# Altium footprint library Connectors THD.PcbLib: 631 footprints (part 5 of 46) (continued)
## 3M_N3429-D202RB [mm] "3M, 3000 Series, 2x26 Contacts - Pitch 2.54mm - Right Angle Four-Wall Condo Header (Black) With Short Roll Pin Latch/Ejectors"
height 15.5
pads (54):
  round 1.7 hole 1: 1L(-15.24,1.27) 1U(-15.24,-3.81) 2L(-15.24,3.81) 2U(-15.24,-1.27) 3L(-12.7,1.27) 3U(-12.7,-3.81) 4L(-12.7,3.81) 4U(-12.7,-1.27) 5L(-10.16,1.27) 5U(-10.16,-3.81) 6L(-10.16,3.81) 6U(-10.16,-1.27) 7L(-7.62,1.27) 7U(-7.62,-3.81) 8L(-7.62,3.81) 8U(-7.62,-1.27) 9L(-5.08,1.27) 9U(-5.08,-3.81) 10L(-5.08,3.81) 10U(-5.08,-1.27) 11L(-2.54,1.27) 11U(-2.54,-3.81) 12L(-2.54,3.81) 12U(-2.54,-1.27) 13L(0,1.27) 13U(0,-3.81) 14L(0,3.81) 14U(0,-1.27) 15L(2.54,1.27) 15U(2.54,-3.81) 16L(2.54,3.81) 16U(2.54,-1.27) 17L(5.08,1.27) 17U(5.08,-3.81) 18L(5.08,3.81) 18U(5.08,-1.27) 19L(7.62,1.27) 19U(7.62,-3.81) 20L(7.62,3.81) 20U(7.62,-1.27) 21L(10.16,1.27) 21U(10.16,-3.81) 22L(10.16,3.81) 22U(10.16,-1.27) 23L(12.7,1.27) 23U(12.7,-3.81) 24L(12.7,3.81) 24U(12.7,-1.27) 25L(15.24,1.27) 25U(15.24,-3.81) 26L(15.24,3.81) 26U(15.24,-1.27)
  round 4.6 hole 2.6: MTG1(-21.146,3.073) MTG2(21.146,3.073)
Top Overlay:
  circle w0.2: c-20.828,8.915 r0.953
  circle w0.2: c20.828,8.915 r0.953
  circle w0.2: c20.828,8.915 r0.953
  circle w0.2: c-20.828,8.915 r0.953
  circle w0.2: c-20.828,8.915 r0.953
  circle w0.3: c-15.313,-5.913 r0.15
  lines w0.2: -32.583,16.687 -24.319,12.71 ; -29.8,11.768 -27.52,16.505 -30.644,18.009 -35.66,14.588 -28.229,11.011 -25.831,8.554 ; -26.162,0.533 -24.702,0.533 ; -22.149,16.789 -22.149,24.74 -16.891,21.704 -16.891,18.237 -22.149,18.237 ; -18.923,17.297 -18.923,22.877 ; -16.478,13.741 -15.208,11.542 -14.671,12.471 ; -2.032,7.645 2.032,7.645 ; 18.923,17.297 18.923,22.877 ; 22.149,16.789 22.149,24.74 16.891,21.704 16.891,18.237 22.149,18.237 ; 24.319,12.71 32.583,16.687 ; 24.702,0.533 26.162,0.533 ; 25.831,8.554 28.229,11.011 35.66,14.588 30.644,18.009 27.52,16.505 29.8,11.768 ; -26.162,-5.309 -26.162,7.645 -22.834,16.789 -21.992,16.789 ccw(c-20.828,17.297) -19.558,17.297 -18.716,17.297 -18.286,14.859 ccw(c-16.989,15.053) -16.954,13.741 -14.929,13.741 -14.929,12.471 -13.011,12.471 -13.011,13.741 -2.032,13.741 -2.032,6.121 2.032,6.121 2.032,13.741 10.471,13.741 10.471,12.471 12.389,12.471 12.389,13.741 16.954,13.741 ccw(c16.989,15.053) 18.286,14.859 18.716,17.297 19.558,17.297 ccw(c20.828,17.297) 21.992,16.789 22.834,16.789 26.162,7.645 26.162,-5.309 -26.162,-5.309
  text "26" at 16.5,3.429 h1.02
  text "1" at -17.272,0.84 h1.02
  text "1" at -17.272,-4.24 h1.02
  text "UPPER" at -22.75,-4.25 h1
  text "LOWER" at -16.125,5.475 h1
  text "26" at 16.5,-1.651 h1.02
Mechanical 8:
  drawing of 245 lines, arcs and shapes, not listed
Mechanical 14:
  circle w0.1: c-21.146,3.073 r1.27
  circle w0.1: c21.146,3.073 r1.27
  circle w0.1: c-20.828,8.915 r0.953
  circle w0.1: c20.828,8.915 r0.953
  lines w0.1: -32.583,16.687 -24.319,12.71 ; -29.8,11.768 -27.52,16.505 -30.644,18.009 -35.66,14.588 -28.229,11.011 -25.831,8.554 ; -26.162,0.533 -24.702,0.533 ccw(c-24.194,0.533) -23.686,0.533 -23.647,0.533 -23.647,4.518 -21.146,5.962 -18.644,4.518 -18.644,0.533 18.644,0.533 18.644,4.518 21.146,5.962 23.647,4.518 23.647,0.533 23.686,0.533 ccw(c24.194,0.533) 24.702,0.533 26.162,0.533 ; -22.149,16.789 -22.149,24.74 -16.891,21.704 -16.891,18.237 -22.149,18.237 ; -18.923,17.297 -18.923,22.877 ; -16.478,13.741 -15.208,11.542 -14.671,12.471 ; -6.858,0.533 ccw(c-6.35,0.533) -5.842,0.533 ; -2.032,7.645 2.032,7.645 ; 5.842,0.533 ccw(c6.35,0.533) 6.858,0.533 ; 18.923,17.297 18.923,22.877 ; 22.149,16.789 22.149,24.74 16.891,21.704 16.891,18.237 22.149,18.237 ; 24.319,12.71 32.583,16.687 ; 25.831,8.554 28.229,11.011 35.66,14.588 30.644,18.009 27.52,16.505 29.8,11.768 ; -26.162,-5.309 -26.162,7.645 -22.834,16.789 -21.992,16.789 ccw(c-20.828,17.297) -19.558,17.297 -18.716,17.297 -18.286,14.859 ccw(c-16.989,15.053) -16.954,13.741 -14.929,13.741 -14.929,12.471 -13.011,12.471 -13.011,13.741 -2.032,13.741 -2.032,6.121 2.032,6.121 2.032,13.741 10.471,13.741 10.471,12.471 12.389,12.471 12.389,13.741 16.954,13.741 ccw(c16.989,15.053) 18.286,14.859 18.716,17.297 19.558,17.297 ccw(c20.828,17.297) 21.992,16.789 22.834,16.789 26.162,7.645 26.162,-5.309 -26.162,-5.309
  text "26" at 16.5,3.429 h1.02
  text "1" at -17.272,0.84 h1.02
  text "1" at -17.272,-4.24 h1.02
  text "1" at -17.272,-4.24 h1.02
  text "UPPER" at -22.75,-4.25 h1
  text "LOWER" at -16.125,5.475 h1
  text "26" at 16.5,-1.651 h1.02
3D body: height 15.49, standoff -3.81, extent -35.558,-5.309 35.558,18.009

## 3M_N3431-5302RB [mm] "3M, 3000 Series, 34 Contacts - Pitch 2.54mm - Right Angle Four-Wall Header (Black) With Long Roll Pin Latch/Ejectors"
height 24.6
pads (36):
  round 1.6 hole 0.9: 1(-20.32,-1.27) 2(-20.32,1.27) 3(-17.78,-1.27) 4(-17.78,1.27) 5(-15.24,-1.27) 6(-15.24,1.27) 7(-12.7,-1.27) 8(-12.7,1.27) 9(-10.16,-1.27) 10(-10.16,1.27) 11(-7.62,-1.27) 12(-7.62,1.27) 13(-5.08,-1.27) 14(-5.08,1.27) 15(-2.54,-1.27) 16(-2.54,1.27) 17(0,-1.27) 18(0,1.27) 19(2.54,-1.27) 20(2.54,1.27) 21(5.08,-1.27) 22(5.08,1.27) 23(7.62,-1.27) 24(7.62,1.27) 25(10.16,-1.27) 26(10.16,1.27) 27(12.7,-1.27) 28(12.7,1.27) 29(15.24,-1.27) 30(15.24,1.27) 31(17.78,-1.27) 32(17.78,1.27) 33(20.32,-1.27) 34(20.32,1.27)
  round 4.6 hole 2.8: MTG1(-26.226,0.533) MTG2(26.232,0.533)
Top Overlay:
  circle w0.2: c-25.908,6.375 r0.787
  circle w0.2: c-20.393,-3.048 r0.15
  circle w0.2: c25.908,6.375 r0.787
  lines w0.2: -28.13,-2.007 -31.242,-2.007 -31.242,5.105 -27.914,14.249 -27.072,14.249 ccw(c-25.908,14.757) -24.638,14.757 -23.796,14.757 -23.354,12.251 ccw(c-22.103,12.471) -22.103,11.201 22.103,11.201 ccw(c22.103,12.471) 23.354,12.251 23.796,14.757 24.638,14.757 ccw(c25.908,14.757) 27.072,14.249 27.914,14.249 31.242,5.105 31.242,-2.007 28.13,-2.007 ; -27.229,14.249 -27.229,24.561 -27.076,24.649 -21.971,21.702 -21.971,18.336 -22.073,18.235 -27.229,18.235 ; -24.003,14.757 -24.003,22.875 ; -21.584,11.201 -20.314,9.002 -19.777,9.931 ; -20.009,11.201 -20.009,9.931 -18.091,9.931 -18.098,11.201 ; -2.032,5.105 2.032,5.105 ; -2.032,11.201 -2.032,3.581 2.032,3.581 2.032,11.201 ; -1.581,5.105 -1.581,11.201 ; -0.946,5.105 -0.946,11.201 ; 0.959,5.105 0.959,11.201 ; 1.594,5.105 1.594,11.201 ; 24.027,14.757 24.027,22.875 ; 27.229,14.249 27.229,24.561 27.076,24.649 21.971,21.702 21.971,18.336 22.073,18.235 27.229,18.235
  text "1" at -22.352,-1.7 h1.02
  text "34" at 19.685,2.667 h1.02
Mechanical 14:
  circle w0.1: c-25.908,6.375 r0.787
  circle w0.1: c-26.226,0.533 r1.27
  circle w0.1: c25.908,6.375 r0.787
  circle w0.1: c26.226,0.533 r1.27
  lines w0.1: -28.727,-2.007 -28.727,1.978 -26.226,3.422 -23.724,1.978 -23.724,-2.007 ; -27.229,14.249 -27.229,24.561 -27.076,24.649 -21.971,21.702 -21.971,18.336 -22.073,18.235 -27.229,18.235 ; -24.003,14.757 -24.003,22.875 ; -21.584,11.201 -20.314,9.002 -19.777,9.931 ; -20.009,11.201 -20.009,9.931 -18.091,9.931 -18.098,11.201 ; -2.032,5.105 2.032,5.105 ; -2.032,11.201 -2.032,3.581 2.032,3.581 2.032,11.201 ; -1.581,5.105 -1.581,11.201 ; -0.946,5.105 -0.946,11.201 ; 0.959,5.105 0.959,11.201 ; 1.594,5.105 1.594,11.201 ; 23.724,-2.007 23.724,1.978 26.226,3.422 28.727,1.978 28.727,-2.007 ; 24.027,14.757 24.027,22.875 ; 27.229,14.249 27.229,24.561 27.076,24.649 21.971,21.702 21.971,18.336 22.073,18.235 27.229,18.235 ; -31.242,-2.007 31.242,-2.007 31.242,5.105 27.914,14.249 27.072,14.249 cw(c25.908,14.757) 24.638,14.757 23.796,14.757 23.354,12.251 cw(c22.103,12.471) 22.103,11.201 -22.103,11.201 cw(c-22.103,12.471) -23.354,12.251 -23.796,14.757 -24.638,14.757 cw(c-25.908,14.757) -27.072,14.249 -27.914,14.249 -31.242,5.105 -31.242,-2.007
  text "1" at -22.352,-1.7 h1.02
  text "34" at 19.685,2.667 h1.02
3D body: height 8.64, standoff -3.94, extent -31.307,-2.514 31.307,24.663

## 3M_N3431-6202RB [mm] "3M, 3000 Series, 34 Contacts - Pitch 2.54mm - Straight Four-Wall Header (Black) With Short Roll Pin Latch/Ejectors"
height 24.6
pads (36):
  round 1.6 hole 0.9: 1(-20.32,-1.27) 2(-20.32,1.27) 3(-17.78,-1.27) 4(-17.78,1.27) 5(-15.24,-1.27) 6(-15.24,1.27) 7(-12.7,-1.27) 8(-12.7,1.27) 9(-10.16,-1.27) 10(-10.16,1.27) 11(-7.62,-1.27) 12(-7.62,1.27) 13(-5.08,-1.27) 14(-5.08,1.27) 15(-2.54,-1.27) 16(-2.54,1.27) 17(0,-1.27) 18(0,1.27) 19(2.54,-1.27) 20(2.54,1.27) 21(5.08,-1.27) 22(5.08,1.27) 23(7.62,-1.27) 24(7.62,1.27) 25(10.16,-1.27) 26(10.16,1.27) 27(12.7,-1.27) 28(12.7,1.27) 29(15.24,-1.27) 30(15.24,1.27) 31(17.78,-1.27) 32(17.78,1.27) 33(20.32,-1.27) 34(20.32,1.27)
  round 4.6 hole 2.8: MTG1(-29.274,-0.254) MTG2(29.274,-0.254)
Top Overlay:
  lines w0.2: -31.242,-2 -31.242,-4.318 31.242,-4.318 31.242,-2 ; -31.242,1.7 -31.242,4.3 ; -31.242,4.318 31.242,4.318 ; -2.032,-4.318 -2.032,-3.175 ; 2.032,-4.318 2.032,-3.175 ; 31.242,1.7 31.242,4.3 ; -24.257,-3.175 -24.257,3.175 24.257,3.175 24.257,-3.175 -24.257,-3.175 ; -21.59,-3.175 -19.05,-3.175 -20.32,-4.318 -21.59,-3.175
  text "34" at 21.555,1.727 h1.02
  text "1" at -22.657,-2.921 h1.02
Mechanical 8:
  lines w0.1: -21.32,-1.27 -20.32,-1.27 ; -21.32,1.27 -20.32,1.27 ; -20.32,-2.27 -20.32,-1.27 ; -20.32,-0.27 -20.32,-1.27 ; -20.32,0.27 -20.32,1.27 ; -20.32,2.27 -20.32,1.27 ; -19.32,-1.27 -20.32,-1.27 ; -19.32,1.27 -20.32,1.27 ; -18.78,-1.27 -17.78,-1.27 ; -18.78,1.27 -17.78,1.27 ; -17.78,-2.27 -17.78,-1.27 ; -17.78,-0.27 -17.78,-1.27 ; -17.78,0.27 -17.78,1.27 ; -17.78,2.27 -17.78,1.27 ; -16.78,-1.27 -17.78,-1.27 ; -16.78,1.27 -17.78,1.27 ; -16.24,-1.27 -15.24,-1.27 ; -16.24,1.27 -15.24,1.27 ; -15.24,-2.27 -15.24,-1.27 ; -15.24,-0.27 -15.24,-1.27 ; -15.24,0.27 -15.24,1.27 ; -15.24,2.27 -15.24,1.27 ; -14.24,-1.27 -15.24,-1.27 ; -14.24,1.27 -15.24,1.27 ; -13.7,-1.27 -12.7,-1.27 ; -13.7,1.27 -12.7,1.27 ; -12.7,-2.27 -12.7,-1.27 ; -12.7,-0.27 -12.7,-1.27 ; -12.7,0.27 -12.7,1.27 ; -12.7,2.27 -12.7,1.27 ; -11.7,-1.27 -12.7,-1.27 ; -11.7,1.27 -12.7,1.27 ; -11.16,-1.27 -10.16,-1.27 ; -11.16,1.27 -10.16,1.27 ; -10.16,-2.27 -10.16,-1.27 ; -10.16,-0.27 -10.16,-1.27 ; -10.16,0.27 -10.16,1.27 ; -10.16,2.27 -10.16,1.27 ; -9.16,-1.27 -10.16,-1.27 ; -9.16,1.27 -10.16,1.27 ; -8.62,-1.27 -7.62,-1.27 ; -8.62,1.27 -7.62,1.27 ; -7.62,-2.27 -7.62,-1.27 ; -7.62,-0.27 -7.62,-1.27 ; -7.62,0.27 -7.62,1.27 ; -7.62,2.27 -7.62,1.27 ; -6.62,-1.27 -7.62,-1.27 ; -6.62,1.27 -7.62,1.27 ; -6.08,-1.27 -5.08,-1.27 ; -6.08,1.27 -5.08,1.27 ; -5.08,-2.27 -5.08,-1.27 ; -5.08,-0.27 -5.08,-1.27 ; -5.08,0.27 -5.08,1.27 ; -5.08,2.27 -5.08,1.27 ; -4.08,-1.27 -5.08,-1.27 ; -4.08,1.27 -5.08,1.27 ; -3.54,-1.27 -2.54,-1.27 ; -3.54,1.27 -2.54,1.27 ; -2.54,-2.27 -2.54,-1.27 ; -2.54,-0.27 -2.54,-1.27 ; -2.54,0.27 -2.54,1.27 ; -2.54,2.27 -2.54,1.27 ; -1.54,-1.27 -2.54,-1.27 ; -1.54,1.27 -2.54,1.27 ; -1,-1.27 0,-1.27 ; -1,0 0,0 ; -1,1.27 0,1.27 ; 0,-2.27 0,-1.27 ; 0,-1 0,0 ; 0,-0.27 0,-1.27 ; 0,0.27 0,1.27 ; 0,1 0,0 ; 0,2.27 0,1.27 ; 1,-1.27 0,-1.27 ; 1,0 0,0 ; 1,1.27 0,1.27 ; 1.54,-1.27 2.54,-1.27 ; 1.54,1.27 2.54,1.27 ; 2.54,-2.27 2.54,-1.27 ; 2.54,-0.27 2.54,-1.27 ; 2.54,0.27 2.54,1.27 ; 2.54,2.27 2.54,1.27 ; 3.54,-1.27 2.54,-1.27 ; 3.54,1.27 2.54,1.27 ; 4.08,-1.27 5.08,-1.27 ; 4.08,1.27 5.08,1.27 ; 5.08,-2.27 5.08,-1.27 ; 5.08,-0.27 5.08,-1.27 ; 5.08,0.27 5.08,1.27 ; 5.08,2.27 5.08,1.27 ; 6.08,-1.27 5.08,-1.27 ; 6.08,1.27 5.08,1.27 ; 6.62,-1.27 7.62,-1.27 ; 6.62,1.27 7.62,1.27 ; 7.62,-2.27 7.62,-1.27 ; 7.62,-0.27 7.62,-1.27 ; 7.62,0.27 7.62,1.27 ; 7.62,2.27 7.62,1.27 ; 8.62,-1.27 7.62,-1.27 ; 8.62,1.27 7.62,1.27 ; 9.16,-1.27 10.16,-1.27 ; 9.16,1.27 10.16,1.27 ; 10.16,-2.27 10.16,-1.27 ; 10.16,-0.27 10.16,-1.27 ; 10.16,0.27 10.16,1.27 ; 10.16,2.27 10.16,1.27 ; 11.16,-1.27 10.16,-1.27 ; 11.16,1.27 10.16,1.27 ; 11.7,-1.27 12.7,-1.27 ; 11.7,1.27 12.7,1.27 ; 12.7,-2.27 12.7,-1.27 ; 12.7,-0.27 12.7,-1.27 ; 12.7,0.27 12.7,1.27 ; 12.7,2.27 12.7,1.27 ; 13.7,-1.27 12.7,-1.27 ; 13.7,1.27 12.7,1.27 ; 14.24,-1.27 15.24,-1.27 ; 14.24,1.27 15.24,1.27 ; 15.24,-2.27 15.24,-1.27 ; 15.24,-0.27 15.24,-1.27 ; 15.24,0.27 15.24,1.27 ; 15.24,2.27 15.24,1.27 ; 16.24,-1.27 15.24,-1.27 ; 16.24,1.27 15.24,1.27 ; 16.78,-1.27 17.78,-1.27 ; 16.78,1.27 17.78,1.27 ; 17.78,-2.27 17.78,-1.27 ; 17.78,-0.27 17.78,-1.27 ; 17.78,0.27 17.78,1.27 ; 17.78,2.27 17.78,1.27 ; 18.78,-1.27 17.78,-1.27 ; 18.78,1.27 17.78,1.27 ; 19.32,-1.27 20.32,-1.27 ; 19.32,1.27 20.32,1.27 ; 20.32,-2.27 20.32,-1.27 ; 20.32,-0.27 20.32,-1.27 ; 20.32,0.27 20.32,1.27 ; 20.32,2.27 20.32,1.27 ; 21.32,-1.27 20.32,-1.27 ; 21.32,1.27 20.32,1.27
Mechanical 14:
  circle w0.1: c-29.274,-0.254 r1.27
  circle w0.1: c29.274,-0.254 r1.27
  lines w0.1: -31.242,-3.175 -27.914,-3.175 ; -30.274,-0.254 -29.274,-0.254 ; -29.274,-1.254 -29.274,-0.254 ; -29.274,0.746 -29.274,-0.254 ; -28.274,-0.254 -29.274,-0.254 ; -27.914,-4.318 -27.914,-1.727 -20.955,-1.727 -20.955,1.27 -27.914,1.27 -27.914,4.318 ; -27.072,-4.318 -27.072,-1.727 ; -27.072,1.27 -27.072,4.318 ; -24.639,-4.318 -24.638,-1.727 ; -24.257,-1.727 -24.257,-3.175 24.257,-3.175 24.257,-1.727 ; -24.257,1.27 -24.257,3.175 24.257,3.175 24.257,1.27 ; -17.469,-4.318 -17.469,-3.175 ; -15.551,-4.318 -15.551,-3.175 ; -2.032,-4.318 -2.032,-3.175 ; 2.032,-4.318 2.032,-3.175 ; 18.091,-4.318 18.091,-3.175 ; 20.009,-4.318 20.009,-3.175 ; 23.796,-4.318 23.796,-3.175 ; 23.796,3.175 23.796,4.318 ; 24.638,1.27 24.638,4.318 ; 24.679,-4.318 24.679,-1.727 ; 27.072,-4.318 27.072,-1.727 ; 27.072,1.27 27.072,4.318 ; 27.914,-4.318 27.914,-1.727 20.955,-1.727 20.955,1.27 27.914,1.27 27.914,4.318 ; 27.914,-3.175 31.242,-3.175 ; 27.914,3.175 31.242,3.175 ; 28.274,-0.254 29.274,-0.254 ; 29.274,-1.254 29.274,-0.254 ; 29.274,0.746 29.274,-0.254 ; 30.274,-0.254 29.274,-0.254 ; -31.242,-4.318 -31.242,4.318 31.242,4.318 31.242,-4.318 -31.242,-4.318 ; -31.242,3.175 -27.914,3.175 -31.242,3.175 ; -30.798,-1.134 -29.274,-2.014 -27.75,-1.134 -27.75,0.626 -29.274,1.506 -30.798,0.626 -30.798,-1.134 ; -24.638,1.27 -24.638,4.318 -24.638,1.27 ; -23.796,-4.318 -23.796,-3.175 -23.796,-4.318 ; -23.796,3.175 -23.796,4.318 -23.796,3.175 ; -21.59,-3.175 -19.05,-3.175 -20.32,-4.318 -21.59,-3.175 ; 27.75,-1.134 29.274,-2.014 30.798,-1.134 30.798,0.626 29.274,1.506 27.75,0.626 27.75,-1.134
  text "34" at 21.555,1.727 h1.02
  text "1" at -22.657,-2.921 h1.02
3D body: height 24.64, standoff -3.94, extent -31.242,-4.318 31.242,4.318

## 3M_N3431-6302RB [mm] "3M, 3000 Series, 34 Contacts - Pitch 2.54mm - Straight Four-Wall Header (Black) With Long Roll Pin Latch/Ejectors"
height 27.2
pads (36):
  round 1.6 hole 0.9: 1(-20.32,-1.27) 2(-20.32,1.27) 3(-17.78,-1.27) 4(-17.78,1.27) 5(-15.24,-1.27) 6(-15.24,1.27) 7(-12.7,-1.27) 8(-12.7,1.27) 9(-10.16,-1.27) 10(-10.16,1.27) 11(-7.62,-1.27) 12(-7.62,1.27) 13(-5.08,-1.27) 14(-5.08,1.27) 15(-2.54,-1.27) 16(-2.54,1.27) 17(0,-1.27) 18(0,1.27) 19(2.54,-1.27) 20(2.54,1.27) 21(5.08,-1.27) 22(5.08,1.27) 23(7.62,-1.27) 24(7.62,1.27) 25(10.16,-1.27) 26(10.16,1.27) 27(12.7,-1.27) 28(12.7,1.27) 29(15.24,-1.27) 30(15.24,1.27) 31(17.78,-1.27) 32(17.78,1.27) 33(20.32,-1.27) 34(20.32,1.27)
  round 4.6 hole 2.8: MTG1(-29.274,-0.254) MTG2(29.274,-0.254)
Top Overlay:
  lines w0.2: -31.242,-2 -31.242,-4.318 31.242,-4.318 31.242,-2 ; -31.242,1.7 -31.242,4.3 ; -31.242,4.318 31.242,4.318 ; -2.032,-4.318 -2.032,-3.175 ; 2.032,-4.318 2.032,-3.175 ; 31.242,1.7 31.242,4.3 ; -24.257,-3.175 -24.257,3.175 24.257,3.175 24.257,-3.175 -24.257,-3.175 ; -21.59,-3.175 -19.05,-3.175 -20.32,-4.318 -21.59,-3.175
  text "34" at 21.555,1.727 h1.02
  text "1" at -22.657,-2.921 h1.02
Mechanical 8:
  lines w0.1: -21.32,-1.27 -20.32,-1.27 ; -21.32,1.27 -20.32,1.27 ; -20.32,-2.27 -20.32,-1.27 ; -20.32,-0.27 -20.32,-1.27 ; -20.32,0.27 -20.32,1.27 ; -20.32,2.27 -20.32,1.27 ; -19.32,-1.27 -20.32,-1.27 ; -19.32,1.27 -20.32,1.27 ; -18.78,-1.27 -17.78,-1.27 ; -18.78,1.27 -17.78,1.27 ; -17.78,-2.27 -17.78,-1.27 ; -17.78,-0.27 -17.78,-1.27 ; -17.78,0.27 -17.78,1.27 ; -17.78,2.27 -17.78,1.27 ; -16.78,-1.27 -17.78,-1.27 ; -16.78,1.27 -17.78,1.27 ; -16.24,-1.27 -15.24,-1.27 ; -16.24,1.27 -15.24,1.27 ; -15.24,-2.27 -15.24,-1.27 ; -15.24,-0.27 -15.24,-1.27 ; -15.24,0.27 -15.24,1.27 ; -15.24,2.27 -15.24,1.27 ; -14.24,-1.27 -15.24,-1.27 ; -14.24,1.27 -15.24,1.27 ; -13.7,-1.27 -12.7,-1.27 ; -13.7,1.27 -12.7,1.27 ; -12.7,-2.27 -12.7,-1.27 ; -12.7,-0.27 -12.7,-1.27 ; -12.7,0.27 -12.7,1.27 ; -12.7,2.27 -12.7,1.27 ; -11.7,-1.27 -12.7,-1.27 ; -11.7,1.27 -12.7,1.27 ; -11.16,-1.27 -10.16,-1.27 ; -11.16,1.27 -10.16,1.27 ; -10.16,-2.27 -10.16,-1.27 ; -10.16,-0.27 -10.16,-1.27 ; -10.16,0.27 -10.16,1.27 ; -10.16,2.27 -10.16,1.27 ; -9.16,-1.27 -10.16,-1.27 ; -9.16,1.27 -10.16,1.27 ; -8.62,-1.27 -7.62,-1.27 ; -8.62,1.27 -7.62,1.27 ; -7.62,-2.27 -7.62,-1.27 ; -7.62,-0.27 -7.62,-1.27 ; -7.62,0.27 -7.62,1.27 ; -7.62,2.27 -7.62,1.27 ; -6.62,-1.27 -7.62,-1.27 ; -6.62,1.27 -7.62,1.27 ; -6.08,-1.27 -5.08,-1.27 ; -6.08,1.27 -5.08,1.27 ; -5.08,-2.27 -5.08,-1.27 ; -5.08,-0.27 -5.08,-1.27 ; -5.08,0.27 -5.08,1.27 ; -5.08,2.27 -5.08,1.27 ; -4.08,-1.27 -5.08,-1.27 ; -4.08,1.27 -5.08,1.27 ; -3.54,-1.27 -2.54,-1.27 ; -3.54,1.27 -2.54,1.27 ; -2.54,-2.27 -2.54,-1.27 ; -2.54,-0.27 -2.54,-1.27 ; -2.54,0.27 -2.54,1.27 ; -2.54,2.27 -2.54,1.27 ; -1.54,-1.27 -2.54,-1.27 ; -1.54,1.27 -2.54,1.27 ; -1,-1.27 0,-1.27 ; -1,0 0,0 ; -1,1.27 0,1.27 ; 0,-2.27 0,-1.27 ; 0,-1 0,0 ; 0,-0.27 0,-1.27 ; 0,0.27 0,1.27 ; 0,1 0,0 ; 0,2.27 0,1.27 ; 1,-1.27 0,-1.27 ; 1,0 0,0 ; 1,1.27 0,1.27 ; 1.54,-1.27 2.54,-1.27 ; 1.54,1.27 2.54,1.27 ; 2.54,-2.27 2.54,-1.27 ; 2.54,-0.27 2.54,-1.27 ; 2.54,0.27 2.54,1.27 ; 2.54,2.27 2.54,1.27 ; 3.54,-1.27 2.54,-1.27 ; 3.54,1.27 2.54,1.27 ; 4.08,-1.27 5.08,-1.27 ; 4.08,1.27 5.08,1.27 ; 5.08,-2.27 5.08,-1.27 ; 5.08,-0.27 5.08,-1.27 ; 5.08,0.27 5.08,1.27 ; 5.08,2.27 5.08,1.27 ; 6.08,-1.27 5.08,-1.27 ; 6.08,1.27 5.08,1.27 ; 6.62,-1.27 7.62,-1.27 ; 6.62,1.27 7.62,1.27 ; 7.62,-2.27 7.62,-1.27 ; 7.62,-0.27 7.62,-1.27 ; 7.62,0.27 7.62,1.27 ; 7.62,2.27 7.62,1.27 ; 8.62,-1.27 7.62,-1.27 ; 8.62,1.27 7.62,1.27 ; 9.16,-1.27 10.16,-1.27 ; 9.16,1.27 10.16,1.27 ; 10.16,-2.27 10.16,-1.27 ; 10.16,-0.27 10.16,-1.27 ; 10.16,0.27 10.16,1.27 ; 10.16,2.27 10.16,1.27 ; 11.16,-1.27 10.16,-1.27 ; 11.16,1.27 10.16,1.27 ; 11.7,-1.27 12.7,-1.27 ; 11.7,1.27 12.7,1.27 ; 12.7,-2.27 12.7,-1.27 ; 12.7,-0.27 12.7,-1.27 ; 12.7,0.27 12.7,1.27 ; 12.7,2.27 12.7,1.27 ; 13.7,-1.27 12.7,-1.27 ; 13.7,1.27 12.7,1.27 ; 14.24,-1.27 15.24,-1.27 ; 14.24,1.27 15.24,1.27 ; 15.24,-2.27 15.24,-1.27 ; 15.24,-0.27 15.24,-1.27 ; 15.24,0.27 15.24,1.27 ; 15.24,2.27 15.24,1.27 ; 16.24,-1.27 15.24,-1.27 ; 16.24,1.27 15.24,1.27 ; 16.78,-1.27 17.78,-1.27 ; 16.78,1.27 17.78,1.27 ; 17.78,-2.27 17.78,-1.27 ; 17.78,-0.27 17.78,-1.27 ; 17.78,0.27 17.78,1.27 ; 17.78,2.27 17.78,1.27 ; 18.78,-1.27 17.78,-1.27 ; 18.78,1.27 17.78,1.27 ; 19.32,-1.27 20.32,-1.27 ; 19.32,1.27 20.32,1.27 ; 20.32,-2.27 20.32,-1.27 ; 20.32,-0.27 20.32,-1.27 ; 20.32,0.27 20.32,1.27 ; 20.32,2.27 20.32,1.27 ; 21.32,-1.27 20.32,-1.27 ; 21.32,1.27 20.32,1.27
Mechanical 14:
  circle w0.1: c-29.274,-0.254 r1.27
  circle w0.1: c29.274,-0.254 r1.27
  lines w0.1: -31.242,-3.175 -27.914,-3.175 ; -30.274,-0.254 -29.274,-0.254 ; -29.274,-1.254 -29.274,-0.254 ; -29.274,0.746 -29.274,-0.254 ; -28.274,-0.254 -29.274,-0.254 ; -27.914,-4.318 -27.914,-1.727 -20.955,-1.727 -20.955,1.27 -27.914,1.27 -27.914,4.318 ; -27.072,-4.318 -27.072,-1.727 ; -27.072,1.27 -27.072,4.318 ; -24.639,-4.318 -24.638,-1.727 ; -24.257,-1.727 -24.257,-3.175 24.257,-3.175 24.257,-1.727 ; -24.257,1.27 -24.257,3.175 24.257,3.175 24.257,1.27 ; -17.469,-4.318 -17.469,-3.175 ; -15.551,-4.318 -15.551,-3.175 ; -2.032,-4.318 -2.032,-3.175 ; 2.032,-4.318 2.032,-3.175 ; 18.091,-4.318 18.091,-3.175 ; 20.009,-4.318 20.009,-3.175 ; 23.796,-4.318 23.796,-3.175 ; 23.796,3.175 23.796,4.318 ; 24.638,1.27 24.638,4.318 ; 24.679,-4.318 24.679,-1.727 ; 27.072,-4.318 27.072,-1.727 ; 27.072,1.27 27.072,4.318 ; 27.914,-4.318 27.914,-1.727 20.955,-1.727 20.955,1.27 27.914,1.27 27.914,4.318 ; 27.914,-3.175 31.242,-3.175 ; 27.914,3.175 31.242,3.175 ; 28.274,-0.254 29.274,-0.254 ; 29.274,-1.254 29.274,-0.254 ; 29.274,0.746 29.274,-0.254 ; 30.274,-0.254 29.274,-0.254 ; -31.242,-4.318 -31.242,4.318 31.242,4.318 31.242,-4.318 -31.242,-4.318 ; -31.242,3.175 -27.914,3.175 -31.242,3.175 ; -30.798,-1.134 -29.274,-2.014 -27.75,-1.134 -27.75,0.626 -29.274,1.506 -30.798,0.626 -30.798,-1.134 ; -24.638,1.27 -24.638,4.318 -24.638,1.27 ; -23.796,-4.318 -23.796,-3.175 -23.796,-4.318 ; -23.796,3.175 -23.796,4.318 -23.796,3.175 ; -21.59,-3.175 -19.05,-3.175 -20.32,-4.318 -21.59,-3.175 ; 27.75,-1.134 29.274,-2.014 30.798,-1.134 30.798,0.626 29.274,1.506 27.75,0.626 27.75,-1.134
  text "34" at 21.555,1.727 h1.02
  text "1" at -22.657,-2.921 h1.02
3D body: height 27.18, standoff -3.94, extent -31.242,-4.318 31.242,4.318

## 3M_N3432-5302RB [mm] "3M, 3000 Series, 40 Contacts - Pitch 2.54mm - Right Angle Four-Wall Header (Black) With Long Roll Pin Latch/Ejectors"
height 8.6
pads (42):
  round 1.6 hole 0.9: 1(-24.13,-1.27) 2(-24.13,1.27) 3(-21.59,-1.27) 4(-21.59,1.27) 5(-19.05,-1.27) 6(-19.05,1.27) 7(-16.51,-1.27) 8(-16.51,1.27) 9(-13.97,-1.27) 10(-13.97,1.27) 11(-11.43,-1.27) 12(-11.43,1.27) 13(-8.89,-1.27) 14(-8.89,1.27) 15(-6.35,-1.27) 16(-6.35,1.27) 17(-3.81,-1.27) 18(-3.81,1.27) 19(-1.27,-1.27) 20(-1.27,1.27) 21(1.27,-1.27) 22(1.27,1.27) 23(3.81,-1.27) 24(3.81,1.27) 25(6.35,-1.27) 26(6.35,1.27) 27(8.89,-1.27) 28(8.89,1.27) 29(11.43,-1.27) 30(11.43,1.27) 31(13.97,-1.27) 32(13.97,1.27) 33(16.51,-1.27) 34(16.51,1.27) 35(19.05,-1.27) 36(19.05,1.27) 37(21.59,-1.27) 38(21.59,1.27) 39(24.13,-1.27) 40(24.13,1.27)
  round 4.6 hole 2.8: MTG1(-30.036,0.533) MTG2(30.042,0.533)
Top Overlay:
  circle w0.2: c-29.718,6.375 r0.787
  circle w0.2: c29.718,6.375 r0.787
  circle w0.2: c-24.203,-3.048 r0.15
  lines w0.2: -31.94,-2.007 -35.052,-2.007 -35.052,5.105 -31.724,14.249 -30.882,14.249 ccw(c-29.718,14.757) -28.448,14.757 -27.606,14.757 -27.164,12.251 ccw(c-25.913,12.471) -25.913,11.201 25.913,11.201 ccw(c25.913,12.471) 27.164,12.251 27.606,14.757 28.448,14.757 ccw(c29.718,14.757) 30.882,14.249 31.724,14.249 35.052,5.105 35.052,-2.007 31.94,-2.007 ; -31.039,14.249 -31.039,24.561 -30.886,24.649 -25.781,21.702 -25.781,18.336 -25.883,18.235 -31.039,18.235 ; -27.813,14.757 -27.813,22.875 ; -25.394,11.201 -24.124,9.002 -23.587,9.931 ; -23.819,11.201 -23.819,9.931 -21.901,9.931 -21.908,11.201 ; -2.032,5.105 2.032,5.105 ; -2.032,11.201 -2.032,3.581 2.032,3.581 2.032,11.201 ; -1.581,5.105 -1.581,11.201 ; -0.946,5.105 -0.946,11.201 ; 0.959,5.105 0.959,11.201 ; 1.594,5.105 1.594,11.201 ; 27.837,14.757 27.837,22.875 ; 31.039,14.249 31.039,24.561 30.886,24.649 25.781,21.702 25.781,18.336 25.883,18.235 31.039,18.235
  text "1" at -26.162,-1.7 h1.02
  text "40" at 23.495,2.667 h1.02
Mechanical 8:
  drawing of 172 lines, arcs and shapes, not listed
Mechanical 14:
  circle w0.1: c-30.036,0.533 r1.27
  circle w0.1: c-29.718,6.375 r0.787
  circle w0.1: c30.036,0.533 r1.27
  circle w0.1: c29.718,6.375 r0.787
  lines w0.1: -32.537,-2.007 -32.537,1.978 -30.036,3.422 -27.534,1.978 -27.534,-2.007 ; -31.039,14.249 -31.039,24.561 -30.886,24.649 -25.781,21.702 -25.781,18.336 -25.883,18.235 -31.039,18.235 ; -27.813,14.757 -27.813,22.875 ; -25.394,11.201 -24.124,9.002 -23.587,9.931 ; -23.819,11.201 -23.819,9.931 -21.901,9.931 -21.908,11.201 ; -2.032,5.105 2.032,5.105 ; -2.032,11.201 -2.032,3.581 2.032,3.581 2.032,11.201 ; -1.581,5.105 -1.581,11.201 ; -0.946,5.105 -0.946,11.201 ; 0.959,5.105 0.959,11.201 ; 1.594,5.105 1.594,11.201 ; 27.534,-2.007 27.534,1.978 30.036,3.422 32.537,1.978 32.537,-2.007 ; 27.837,14.757 27.837,22.875 ; 31.039,14.249 31.039,24.561 30.886,24.649 25.781,21.702 25.781,18.336 25.883,18.235 31.039,18.235 ; -35.052,-2.007 -35.052,5.105 -31.724,14.249 -30.882,14.249 ccw(c-29.718,14.757) -28.448,14.757 -27.606,14.757 -27.164,12.251 ccw(c-25.913,12.471) -25.913,11.201 25.913,11.201 ccw(c25.913,12.471) 27.164,12.251 27.606,14.757 28.448,14.757 ccw(c29.718,14.757) 30.882,14.249 31.724,14.249 35.052,5.105 35.052,-2.007 -35.052,-2.007
  text "1" at -26.162,-1.7 h1.02
  text "40" at 23.495,2.667 h1.02
3D body: height 8.64, standoff -3.94, extent -35.052,-2.532 35.052,24.645

## 3M_N3432_6002RB [mm] "3M, 3000 Series, 40 Contacts - Pitch 2.54mm - Straight Four-Wall Header (Black) Without Roll Pin and Latch/Ejectors Installed"
height 17.3
pads (42):
  round 1.6 hole 0.9: 1(-24.13,-1.27) 2(-24.13,1.27) 3(-21.59,-1.27) 4(-21.59,1.27) 5(-19.05,-1.27) 6(-19.05,1.27) 7(-16.51,-1.27) 8(-16.51,1.27) 9(-13.97,-1.27) 10(-13.97,1.27) 11(-11.43,-1.27) 12(-11.43,1.27) 13(-8.89,-1.27) 14(-8.89,1.27) 15(-6.35,-1.27) 16(-6.35,1.27) 17(-3.81,-1.27) 18(-3.81,1.27) 19(-1.27,-1.27) 20(-1.27,1.27) 21(1.27,-1.27) 22(1.27,1.27) 23(3.81,-1.27) 24(3.81,1.27) 25(6.35,-1.27) 26(6.35,1.27) 27(8.89,-1.27) 28(8.89,1.27) 29(11.43,-1.27) 30(11.43,1.27) 31(13.97,-1.27) 32(13.97,1.27) 33(16.51,-1.27) 34(16.51,1.27) 35(19.05,-1.27) 36(19.05,1.27) 37(21.59,-1.27) 38(21.59,1.27) 39(24.13,-1.27) 40(24.13,1.27)
  round 4.6 hole 2.6: MTG1(-33.07,-0.25) MTG2(33.07,-0.25)
Top Overlay:
  lines w0.2: -35.052,-2.102 -35.052,-4.318 35.052,-4.318 35.052,-2.102 ; -35.052,1.594 -35.052,4.318 35.052,4.318 35.052,1.594 ; -2.032,-4.318 -2.032,-3.175 ; 2.032,-4.318 2.032,-3.175 ; -28.067,-3.175 28.067,-3.175 28.067,3.175 -28.067,3.175 -28.067,-3.175 ; -25.4,-3.175 -22.86,-3.175 -24.13,-4.318 -25.4,-3.175
  text "1" at -25.992,-2.446 h1
  text "40" at 25.365,1.727 h1
Mechanical 8:
  drawing of 172 lines, arcs and shapes, not listed
Mechanical 14:
  circle w0.1: c-33.084,-0.254 r1.27
  circle w0.1: c33.084,-0.254 r1.27
  lines w0.1: -35.052,-3.175 -31.724,-3.175 ; -35.052,3.175 -31.724,3.175 ; -31.724,-4.318 -31.724,-1.727 -24.765,-1.727 -24.765,1.27 -31.724,1.27 -31.724,4.318 ; -30.882,-4.318 -30.882,-1.727 ; -30.882,1.27 -30.882,4.318 ; -28.448,-4.318 -28.448,-1.727 ; -28.448,1.27 -28.448,4.318 ; -28.067,-1.727 -28.067,-3.175 28.067,-3.175 28.067,-1.727 ; -28.067,1.27 -28.067,3.175 28.067,3.175 28.067,1.27 ; -27.606,-4.318 -27.606,-3.175 ; -27.606,3.175 -27.606,4.318 ; -27.164,-4.318 -27.164,-3.175 ; -27.164,3.175 -27.164,4.318 ; -25.913,-4.318 -25.913,-3.175 ; -25.913,3.175 -25.913,4.318 ; -21.279,-4.318 -21.279,-3.175 ; -19.361,-4.318 -19.361,-3.175 ; -2.032,-4.318 -2.032,-3.175 ; 2.032,-4.318 2.032,-3.175 ; 21.901,-4.318 21.901,-3.175 ; 23.819,-4.318 23.819,-3.175 ; 25.913,-4.318 25.913,-3.175 ; 25.913,3.175 25.913,4.318 ; 27.164,-4.318 27.164,-3.175 ; 27.164,3.175 27.164,4.318 ; 27.606,-4.318 27.606,-3.175 ; 27.606,3.175 27.606,4.318 ; 28.493,1.27 28.493,4.318 ; 30.882,-4.318 30.882,-1.727 ; 30.882,1.27 30.882,4.318 ; 31.724,-4.318 31.724,-1.727 24.765,-1.727 24.765,1.27 31.724,1.27 31.724,4.318 ; 31.724,-3.175 35.052,-3.175 ; 31.724,3.175 35.052,3.175 ; -35.052,-4.318 35.052,-4.318 35.052,4.318 -35.052,4.318 -35.052,-4.318 ; -34.608,-1.134 -33.084,-2.014 -31.56,-1.134 -31.56,0.626 -33.084,1.506 -34.608,0.626 -34.608,-1.134 ; 31.56,-1.134 33.084,-2.014 34.608,-1.134 34.608,0.626 33.084,1.506 31.56,0.626 31.56,-1.134
  text "1" at -26,-1.2 h1
  text "40" at 25.365,1.727 h1
3D body: height 17.27, standoff -3.94, extent -35.052,-4.318 35.052,4.318